# Altium footprint library microbuilder.PCBLIB: 422 footprints (part 23 of 27)
Each footprint in its own frame and in the unit in brackets; x right, y up, seen from the top. Pads: shape width x height; smd on the part's side, far side on the other; paste and mask are expansions set on the pad; w line width, h text height; cw(c..) or ccw(c..) is an arc to the next point about the centre after c.
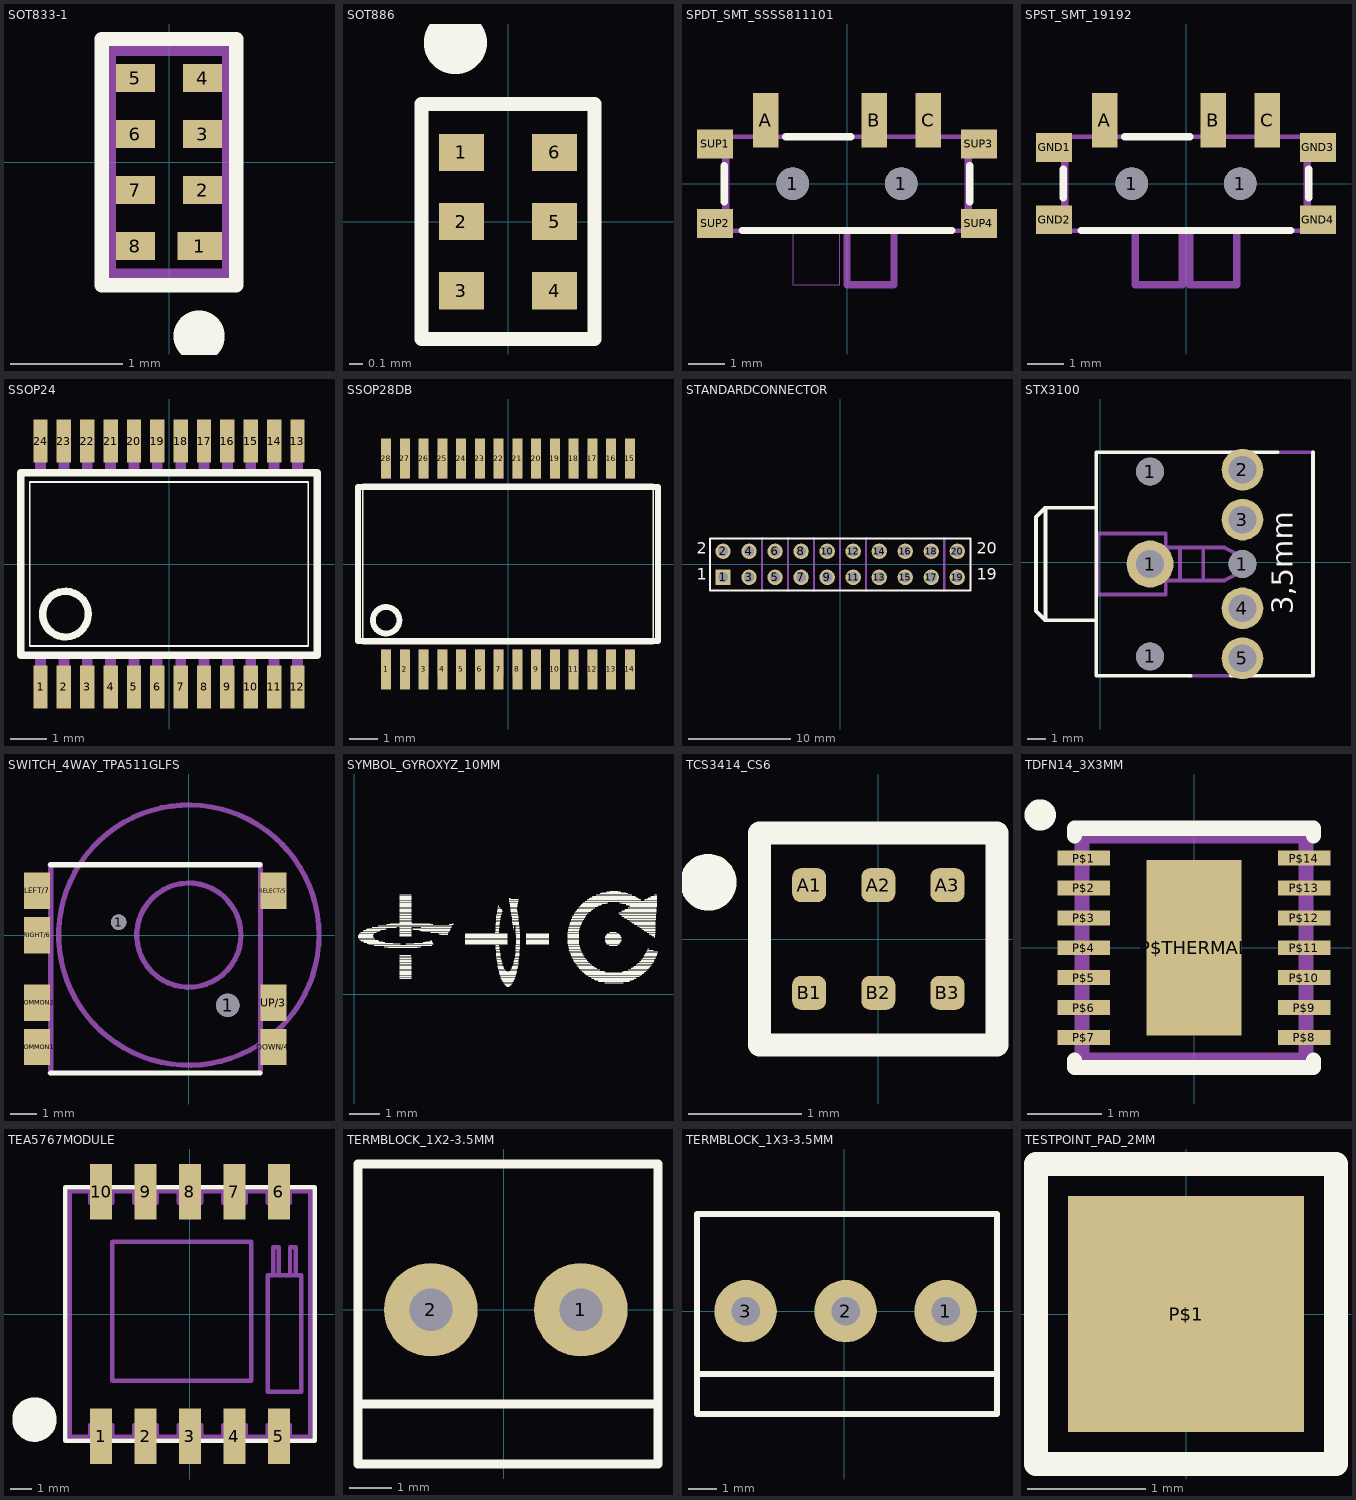
[diagram p22: the footprints below, top view; thin cyan lines are the x and y axes]

## SOT833-1 [mm]
pads (8):
  rect 0.4x0.25 smd: 1(0.275,-0.75)
  rect 0.35x0.25 smd: 2(0.3,-0.25) 3(0.3,0.25) 4(0.3,0.75) 5(-0.3,0.75) 6(-0.3,0.25) 7(-0.3,-0.25) 8(-0.3,-0.75)
Top Overlay:
  circle w0.406: c0.269,-1.554 r0.025
  lines w0.127: -0.6,-1.1 0.6,-1.1 0.6,1.1 -0.6,1.1 -0.6,-1.1
Top Paste:
  rectangle: 0.2,-0.35 0.45,-0.15
  rectangle: 0.2,-0.85 0.45,-0.65
  rectangle: -0.45,-0.85 -0.2,-0.65
  rectangle: -0.45,-0.35 -0.2,-0.15
  rectangle: -0.45,0.15 -0.2,0.35
  rectangle: 0.2,0.15 0.45,0.35
  rectangle: 0.2,0.65 0.45,0.85
  rectangle: -0.45,0.65 -0.2,0.85
Mechanical 16:
  lines w0.1: -0.525,-1 0.525,-1 0.525,1 -0.525,1 -0.525,-1

## SOT886 [mm]
pads (6):
  rect 0.325x0.27 smd: 1(-0.338,0.5) 2(-0.338,0) 3(-0.338,-0.5) 4(0.338,-0.5) 5(0.338,0) 6(0.338,0.5)
Top Overlay:
  circle w0.406: c-0.381,1.295 r0.025
  lines w0.1: -0.625,-0.85 0.625,-0.85 0.625,0.85 -0.625,0.85 -0.625,-0.85
Top Solder:
  rectangle: 0.122,0.315 0.552,0.685
  rectangle: 0.122,-0.185 0.552,0.185
  rectangle: 0.122,-0.685 0.552,-0.315
  region: -0.122,-0.315 -0.552,-0.315 -0.552,-0.685 -0.122,-0.685
  region: -0.122,0.185 -0.552,0.185 -0.552,-0.185 -0.122,-0.185
  region: -0.122,0.685 -0.552,0.685 -0.552,0.315 -0.122,0.315

## SPDT_SMT_SSSS811101 [mm]
pads (9):
  round 0.9 hole 0.9: 1(-1.5,0) 1(1.5,0)
  rect 0.7x1.5 smd: A(-2.25,1.75) B(0.75,1.75) C(2.25,1.75)
  rect 1x0.8 smd: SUP1(-3.65,1.1) SUP2(-3.65,-1.1) SUP3(3.65,1.1) SUP4(3.65,-1.1)
Top Overlay:
  lines w0.203: -3.4,-0.5 -3.4,0.5 ; -2.9,-1.3 2.9,-1.3 ; -1.7,1.3 0.1,1.3 ; 3.4,-0.5 3.4,0.5
Mechanical 16:
  lines w0: -1.5,-1.3 -1.5,-2.8 -0.2,-2.8 -0.2,-1.3
  lines w0.127: -3.35,-1.3 3.35,-1.3 ; -3.35,1.3 3.35,1.3
  lines w0.203: -3.35,-1.3 -3.35,1.3 ; 0,-1.3 0,-2.8 1.3,-2.8 1.3,-1.3 ; 3.35,-1.3 3.35,1.3

## SPST_SMT_19192 [mm]
pads (9):
  round 0.9 hole 0.9: 1(-1.5,0) 1(1.5,0)
  rect 0.7x1.5 smd: A(-2.25,1.75) B(0.75,1.75) C(2.25,1.75)
  rect 1x0.8 smd: GND1(-3.65,1) GND2(-3.65,-1) GND3(3.65,1) GND4(3.65,-1)
Top Overlay:
  lines w0.203: -3.4,-0.4 -3.4,0.4 ; -2.9,-1.3 2.9,-1.3 ; -1.7,1.3 0.1,1.3 ; 3.4,-0.4 3.4,0.4
Mechanical 16:
  lines w0.127: -3.35,-1.3 0.1,-1.3 1.4,-1.3 3.35,-1.3 ; -3.35,1.3 3.35,1.3
  lines w0.203: -3.35,-1.3 -3.35,1.3 ; -1.4,-1.3 -1.4,-2.8 -0.1,-2.8 -0.1,-1.3 ; 0.1,-1.3 0.1,-2.8 1.4,-2.8 1.4,-1.3 ; 3.35,-1.3 3.35,1.3
  text "0" at -1,-2.5 h1.26
  text "1" at 0.5,-2.5 h1.26

## SSOP24 [mm]
pads (24):
  rect 0.4x1.2 smd: 1(-3.575,-3.42) 2(-2.925,-3.42) 3(-2.275,-3.42) 4(-1.625,-3.42) 5(-0.975,-3.42) 6(-0.325,-3.42) 7(0.325,-3.42) 8(0.975,-3.42) 9(1.625,-3.42) 10(2.275,-3.42) 11(2.925,-3.42) 12(3.575,-3.42) 13(3.575,3.42) 14(2.925,3.42) 15(2.275,3.42) 16(1.625,3.42) 17(0.975,3.42) 18(0.325,3.42) 19(-0.325,3.42) 20(-0.975,3.42) 21(-1.625,3.42) 22(-2.275,3.42) 23(-2.925,3.42) 24(-3.575,3.42)
Top Overlay:
  circle w0.203: c-2.883,-1.397 r0.635
  lines w0.051: -3.874,-2.286 3.874,-2.286 3.874,2.286 -3.874,2.286 -3.874,-2.286
  lines w0.203: -4.128,-2.536 4.128,-2.536 4.128,2.536 -4.128,2.536 -4.128,-2.536
Mechanical 16:
  rectangle: -3.725,-3.8 -3.425,-2.6
  rectangle: -3.075,-3.8 -2.775,-2.6
  rectangle: -2.425,-3.8 -2.125,-2.6
  rectangle: -1.775,-3.8 -1.475,-2.6
  rectangle: -1.125,-3.8 -0.825,-2.6
  rectangle: -0.475,-3.8 -0.175,-2.6
  rectangle: 0.175,-3.8 0.475,-2.6
  rectangle: 0.825,-3.8 1.125,-2.6
  rectangle: 1.475,-3.8 1.775,-2.6
  rectangle: 2.125,-3.8 2.425,-2.6
  rectangle: 2.775,-3.8 3.075,-2.6
  rectangle: 3.425,-3.8 3.725,-2.6
  rectangle: 3.425,2.6 3.725,3.8
  rectangle: 2.775,2.6 3.075,3.8
  rectangle: 2.125,2.6 2.425,3.8
  rectangle: 1.475,2.6 1.775,3.8
  rectangle: 0.825,2.6 1.125,3.8
  rectangle: 0.175,2.6 0.475,3.8
  rectangle: -0.475,2.6 -0.175,3.8
  rectangle: -1.125,2.6 -0.825,3.8
  rectangle: -1.775,2.6 -1.475,3.8
  rectangle: -2.425,2.6 -2.125,3.8
  rectangle: -3.075,2.6 -2.775,3.8
  rectangle: -3.725,2.6 -3.425,3.8

## SSOP28DB [mil]
pads (28):
  rect 13.7x55 smd: 1(-166.34,-143.94) 2(-140.75,-143.94) 3(-115.16,-143.94) 4(-89.57,-143.94) 5(-63.98,-143.94) 6(-38.39,-143.94) 7(-12.8,-143.94) 8(12.8,-143.94) 9(38.39,-143.94) 10(63.98,-143.94) 11(89.57,-143.94) 12(115.16,-143.94) 13(140.75,-143.94) 14(166.34,-143.94) 15(166.34,143.94) 16(140.75,143.94) 17(115.16,143.94) 18(89.57,143.94) 19(63.98,143.94) 20(38.39,143.94) 21(12.8,143.94) 22(-12.8,143.94) 23(-38.39,143.94) 24(-63.98,143.94) 25(-89.57,143.94) 26(-115.16,143.94) 27(-140.75,143.94) 28(-166.34,143.94)
Top Overlay:
  circle w8: c-166.34,-76.77 r18.09
  lines w2: -198.35,-108.78 198.35,-108.78 198.35,108.78 -198.35,108.78 -198.35,-108.78
  lines w8: -204.72,-105.32 204.72,-105.32 204.72,105.32 -204.72,105.32 -204.72,-105.32
Mechanical 16:
  rectangle: -172.74,116.76 -159.94,153.54
  rectangle: -172.74,-153.54 -159.94,-116.76
  rectangle: -147.15,-153.54 -134.35,-116.76
  rectangle: -121.56,-153.54 -108.76,-116.76
  rectangle: -147.15,116.76 -134.35,153.54
  rectangle: -121.56,116.76 -108.76,153.54
  rectangle: -95.96,116.76 -83.17,153.54
  rectangle: -70.37,116.76 -57.58,153.54
  rectangle: -44.78,116.76 -31.99,153.54
  rectangle: -19.19,116.76 -6.4,153.54
  rectangle: 6.4,116.76 19.19,153.54
  rectangle: 31.99,116.76 44.78,153.54
  rectangle: 57.58,116.76 70.37,153.54
  rectangle: 83.17,116.76 95.96,153.54
  rectangle: 108.76,116.76 121.56,153.54
  rectangle: 134.35,116.76 147.15,153.54
  rectangle: 159.94,116.76 172.74,153.54
  rectangle: -95.96,-153.54 -83.17,-116.76
  rectangle: -70.37,-153.54 -57.58,-116.76
  rectangle: -44.78,-153.54 -31.99,-116.76
  rectangle: -19.19,-153.54 -6.4,-116.76
  rectangle: 6.4,-153.54 19.19,-116.76
  rectangle: 31.99,-153.54 44.78,-116.76
  rectangle: 57.58,-153.54 70.37,-116.76
  rectangle: 83.17,-153.54 95.96,-116.76
  rectangle: 108.76,-153.54 121.56,-116.76
  rectangle: 134.35,-153.54 147.15,-116.76
  rectangle: 159.94,-153.54 172.74,-116.76

## STANDARDCONNECTOR [mm]
pads (20):
  rect 1.5x1.5 hole 1: 1(-11.43,-1.27)
  round 1.5 hole 1: 2(-11.43,1.27) 3(-8.89,-1.27) 4(-8.89,1.27) 5(-6.35,-1.27) 6(-6.35,1.27) 7(-3.81,-1.27) 8(-3.81,1.27) 9(-1.27,-1.27) 10(-1.27,1.27) 11(1.27,-1.27) 12(1.27,1.27) 13(3.81,-1.27) 14(3.81,1.27) 15(6.35,-1.27) 16(6.35,1.27) 17(8.89,-1.27) 18(8.89,1.27) 19(11.43,-1.27) 20(11.43,1.27)
Top Overlay:
  lines w0.203: -12.7,-2.54 -12.7,2.54 12.7,2.54 12.7,-2.54 -12.7,-2.54
  text "1" at -13.97,-1.905 h1.97
  text "2" at -13.97,0.635 h1.97
  text "19" at 13.335,-1.905 h1.97
  text "20" at 13.335,0.635 h1.97
Mechanical 16:
  rectangle: -11.684,-1.524 -11.176,-1.016
  rectangle: -11.684,1.016 -11.176,1.524
  rectangle: -9.144,1.016 -8.636,1.524
  rectangle: -9.144,-1.524 -8.636,-1.016
  rectangle: -6.604,1.016 -6.096,1.524
  rectangle: -6.604,-1.524 -6.096,-1.016
  rectangle: -4.064,1.016 -3.556,1.524
  rectangle: -1.524,1.016 -1.016,1.524
  rectangle: 1.016,1.016 1.524,1.524
  rectangle: -4.064,-1.524 -3.556,-1.016
  rectangle: -1.524,-1.524 -1.016,-1.016
  rectangle: 1.016,-1.524 1.524,-1.016
  rectangle: 3.556,1.016 4.064,1.524
  rectangle: 3.556,-1.524 4.064,-1.016
  rectangle: 6.096,1.016 6.604,1.524
  rectangle: 6.096,-1.524 6.604,-1.016
  rectangle: 8.636,1.016 9.144,1.524
  rectangle: 8.636,-1.524 9.144,-1.016
  rectangle: 11.176,1.016 11.684,1.524
  rectangle: 11.176,-1.524 11.684,-1.016
  lines w0.203: -7.62,-2.54 -7.62,2.54 ; -5.08,-2.54 -5.08,2.54 ; -2.54,-2.54 -2.54,2.54 ; 0,-2.54 0,2.54 ; 2.54,-2.54 2.54,2.54 ; 10.16,-2.54 10.16,2.54
  text "CS" at -12,-3.5 h0.94
  text "CLK" at -12,3 h0.94
  text "MOSI" at -10,-3.5 h0.94
  text "MISO" at -10,3 h0.94
  text "SCL" at -7,-3.5 h0.94
  text "SDA" at -7,3 h0.94
  text "INT" at -4.5,-3.5 h0.94
  text "INT" at -4.5,3 h0.94
  text "GND" at -2,-3.5 h0.94
  text "GND" at -2,3 h0.94
  text "ADC" at 0.5,-3.5 h0.94
  text "ADC" at 0.5,3 h0.94
  text "GPIO" at 3,-3.5 h0.94
  text "GPIO" at 3,3 h0.94
  text "GPIO" at 5.5,-3.5 h0.94
  text "GPIO" at 5.5,3 h0.94
  text "GPIO" at 8,-3.5 h0.94
  text "GPIO" at 8,3 h0.94
  text "3.3V" at 10.5,-3.5 h0.94
  text "5.0V" at 10.5,3 h0.94

## STX3100 [mm]
pads (8):
  round 1.5 hole 1.5: 1(2.7,-5.1) 1(2.7,4.9) 1(7.7,-0.1)
  round 2.54 hole 1.5: 1(2.7,-0.1)
  round 2.25 hole 1.5: 2(7.7,5) 3(7.7,2.3) 4(7.7,-2.5) 5(7.7,-5.2)
Top Overlay:
  lines w0.203: 4.906,-6.142 -0.212,-6.142 -0.212,-3.148 ; 7.065,-6.142 11.512,-6.142 11.512,5.942 11.51,5.942 ; 9.605,5.942 -0.212,5.942 -0.212,2.948 ; -2.96,-3.148 -0.212,-3.148 ; -2.96,-3.148 -3.468,-2.64 -3.468,2.44 -2.96,2.948 ; -2.96,-3.148 -2.96,2.948 ; -2.96,2.948 -0.212,2.948 ; -0.212,-3.148 -0.212,2.948
  text "3,5mm" at 10.79,-2.831 h1.97
Mechanical 16:
  lines w0.203: 4.806,-6.142 6.965,-6.142 ; 9.605,5.942 11.51,5.942 ; 3.552,-0.989 3.552,0.789 ; 3.552,-0.989 3.552,-1.751 -0.131,-1.751 -0.131,1.551 3.552,1.551 3.552,0.789 ; 3.552,-0.989 4.314,-0.989 ; 3.552,0.789 4.314,0.789 ; 4.314,-0.989 5.584,-0.989 ; 4.314,-0.989 4.314,0.789 ; 4.314,0.789 5.584,0.789 ; 5.584,-0.989 5.584,0.789 ; 5.584,-0.989 6.727,-0.989 7.489,-0.608 7.489,0.408 6.727,0.789 5.584,0.789

## SWITCH_4WAY_TPA511GLFS [mm]
pads (9):
  round 0.6 hole 0.6: 1(-2.7,0.5)
  round 0.9 hole 0.9: 1(1.5,-2.7)
  rect 1x1.4 smd: COMMON1(-5.825,-4.3) COMMON2(-5.825,-2.6) DOWN/4(3.25,-4.3) LEFT/7(-5.825,1.7) RIGHT/6(-5.825,0) SELECT/5(3.25,1.7) UP/3(3.25,-2.6)
Top Overlay:
  lines w0.203: -5.3,-5.3 2.725,-5.3 ; -5.3,2.7 2.725,2.7
Mechanical 16:
  circle w0.203: c0,0 r2
  circle w0.203: c0,0 r5
  rectangle: -6.025,1.2 -5.325,2.2
  rectangle: -6.025,-0.5 -5.325,0.5
  rectangle: 2.75,1.2 3.45,2.2
  rectangle: -6.025,-3.1 -5.325,-2.1
  rectangle: -6.025,-4.8 -5.325,-3.8
  rectangle: 2.75,-4.8 3.45,-3.8
  rectangle: 2.75,-3.1 3.45,-2.1
  lines w0.127: -5.3,-5.3 2.725,-5.3 ; -5.3,2.7 2.725,2.7
  lines w0.203: -5.325,-5.3 -5.3,-5.3 -5.3,2.7 -5.325,2.7 ; 2.75,-5.3 2.75,2.7

## SYMBOL_GYROXYZ_10MM [mm]
Top Overlay:
  drawing of 1168 lines, arcs and shapes, not listed

## TCS3414_CS6 [mm]
pads (6):
  rrect50% 0.3x0.3 smd: A1(-0.61,0.475) A2(0,0.475) A3(0.61,0.475) B1(-0.61,-0.475) B2(0,-0.475) B3(0.61,-0.475)
Top Overlay:
  circle w0.3: c-1.5,0.5 r0.1
  lines w0.203: -1.047,-0.938 -1.047,0.938 1.047,0.938 1.047,-0.938 -1.047,-0.938
Mechanical 16:
  lines w0.127: -1.047,-0.938 1.047,-0.938 1.047,0.938 -1.047,0.938 -1.047,-0.938
  text "A1" at -1.27,0.254 h0.47
  text "A3" at 1.524,0.254 h0.47
  text "B1" at -1.27,-0.762 h0.47
  text "B3" at 1.524,-0.762 h0.47

## TDFN14_3X3MM [mil]
pads (15):
  rect 27.56x7.87 smd: P$1(-58.07,47.24) P$2(-58.07,31.5) P$3(-58.07,15.75) P$4(-58.07,0) P$5(-58.07,-15.75) P$6(-58.07,-31.5) P$7(-58.07,-47.24) P$8(58.07,-47.24) P$9(58.07,-31.5) P$10(58.07,-15.75) P$11(58.07,0) P$12(58.07,15.75) P$13(58.07,31.5) P$14(58.07,47.24)
  rect 50x92.52 smd: P$THERMAL(0,0)
Top Overlay:
  circle w12: c-81,70 r2.24
  lines w8: -62.99,-59.06 -62.99,-62.99 62.99,-62.99 62.99,-59.06 ; -62.99,59.06 -62.99,62.99 62.99,62.99 62.99,59.06
Top Paste:
  rectangle: -19.69,7.87 -3.94,39.37
  rectangle: 3.94,7.87 19.69,39.37
  rectangle: -19.69,-39.37 -3.94,-7.87
  rectangle: 3.94,-39.37 19.69,-7.87
  rectangle: -68.9,43.8 -47.24,50.69
  rectangle: -68.9,28.05 -47.24,34.94
  rectangle: -68.9,12.3 -47.24,19.19
  rectangle: -68.9,-3.44 -47.24,3.44
  rectangle: -68.9,-19.19 -47.24,-12.3
  rectangle: -68.9,-34.94 -47.24,-28.05
  rectangle: -68.9,-50.69 -47.24,-43.8
  rectangle: 47.24,-50.69 68.9,-43.8
  rectangle: 47.24,-34.94 68.9,-28.05
  rectangle: 47.24,-19.19 68.9,-12.3
  rectangle: 47.24,-3.44 68.9,3.44
  rectangle: 47.24,12.3 68.9,19.19
  rectangle: 47.24,28.05 68.9,34.94
  rectangle: 47.24,43.8 68.9,50.69
Top Solder:
  rectangle: -74.8,-54.13 -41.34,54.13
  rectangle: 41.34,-54.13 74.8,54.13
Mechanical 16:
  lines w8: -59.06,-59.06 59.06,-59.06 59.06,59.06 -59.06,59.06 -59.06,-59.06

## TEA5767MODULE [mil]
pads (10):
  rect 40x100 smd: 1(-160,-220) 2(-80,-220) 3(0,-220) 4(80,-220) 5(160,-220) 6(160,220) 7(80,220) 8(0,220) 9(-80,220) 10(-160,220)
Top Overlay:
  circle w40: c-280,-190 r20
  lines w8: -224.41,-228.35 224.41,-228.35 224.41,228.35 -224.41,228.35 -224.41,-228.35
Mechanical 16:
  lines w8: -180,-220 -180,-200 -140,-200 -140,-220 ; -180,220 -180,200 -140,200 -140,220 ; -100,-220 -100,-200 -60,-200 -60,-220 ; -100,220 -100,200 -60,200 -60,220 ; -20,-220 -20,-200 20,-200 20,-220 ; -20,220 -20,200 20,200 20,220 ; 60,-220 60,-200 100,-200 100,-220 ; 60,220 60,200 100,200 100,220 ; 140,-220 140,-200 180,-200 180,-220 ; 140,220 140,200 180,200 180,220 ; 150,70 140,70 140,-140 200,-140 200,70 190,70 ; 150,70 160,70 ; 150,70 150,120 160,120 160,70 ; 160,70 180,70 ; 180,70 190,70 ; 180,70 180,120 190,120 190,70 ; -216.54,-220.47 216.54,-220.47 216.54,220.47 -216.54,220.47 -216.54,-220.47 ; -140,-120 110,-120 110,130 -140,130 -140,-120

## TERMBLOCK_1X2-3.5MM [mil]
pads (2):
  round 86 hole 39.37: 1(70.87,0) 2(-66.93,0)
Top Overlay:
  lines w8: -133.86,-86.61 -133.86,133.86 141.73,133.86 141.73,-86.61 ; -133.86,-86.61 -133.86,-141.73 141.73,-141.73 141.73,-86.61 ; -133.86,-86.61 141.73,-86.61

## TERMBLOCK_1X3-3.5MM [mil]
pads (3):
  round 86 hole 39.37: 1(139.76,0) 2(1.97,0) 3(-135.83,0)
Top Overlay:
  lines w8: -202.76,-86.61 -202.76,133.86 210.63,133.86 210.63,-86.61 ; -202.76,-86.61 -202.76,-141.73 210.63,-141.73 210.63,-86.61 ; -202.76,-86.61 210.63,-86.61

## TESTPOINT_PAD_2MM [mm]
pads (1):
  rect 2x2 smd: P$1(0,0)
Top Overlay:
  lines w0.203: -1.27,-1.27 1.27,-1.27 1.27,1.27 -1.27,1.27 -1.27,-1.27